# Altium footprint library Connectors_THT.PcbLib: 111 footprints (part 3 of 11)
Each footprint in its own frame and in the unit in brackets; x right, y up, seen from the top. Pads: shape width x height; smd on the part's side, far side on the other; paste and mask are expansions set on the pad; w line width, h text height; cw(c..) or ccw(c..) is an arc to the next point about the centre after c.
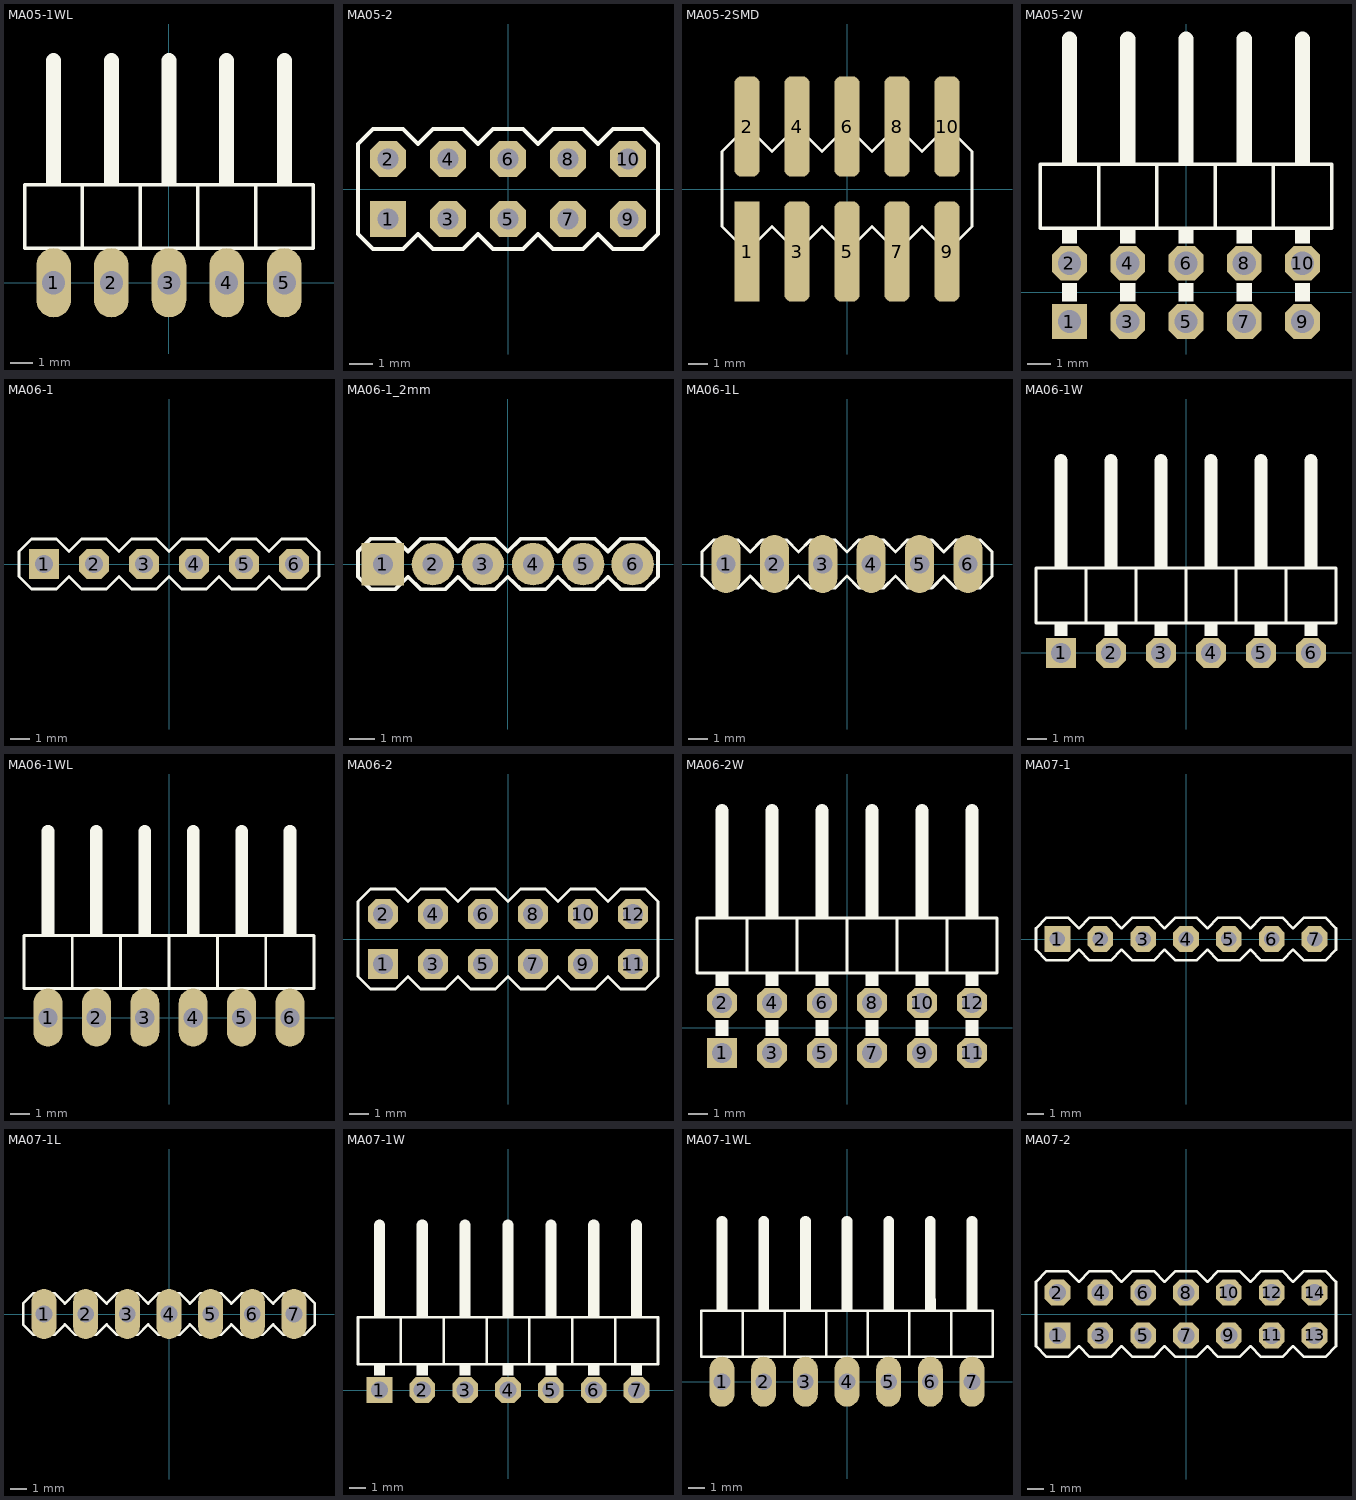
[diagram p2: the footprints below, top view; thin cyan lines are the x and y axes]

## MA05-1WL [mil]
pads (5):
  oval 60x120 hole 40: 1(-200,0) 2(-100,0) 3(0,0) 4(100,0) 5(200,0)
Top Overlay:
  rectangle: -213,34 -187,60
  rectangle: -113,34 -87,60
  rectangle: -13,34 13,60
  rectangle: 87,34 113,60
  rectangle: 187,34 213,60
  rectangle: 187,170 213,200
  rectangle: 87,170 113,200
  rectangle: -13,170 13,200
  rectangle: -113,170 -87,200
  rectangle: -213,170 -187,200
  lines w6: -150,60 -50,60 ; -150,60 -250,60 -250,170 -150,170 ; -150,60 -150,170 ; -150,170 -50,170 ; -50,60 -50,170 ; -50,60 50,60 ; -50,170 50,170 ; 50,60 50,170 ; 50,60 150,60 ; 50,170 150,170 ; 150,60 150,170 ; 150,60 250,60 250,170 150,170
  lines w26: -200,200 -200,385 ; -100,200 -100,385 ; 0,200 0,385 ; 100,200 100,385 ; 200,200 200,385
3D body: height 62.48, standoff 0, extent 187.51,-12.49 212.51,12.51
3D body: height 100, standoff 0, extent 150,60 250,170
3D body: height 62.5, standoff 37.5, extent 187.51,-12.49 212.51,393.76
3D body: height 62.48, standoff 0, extent 87.51,-12.49 112.51,12.51
3D body: height 100, standoff 0, extent 50,60 150,170
3D body: height 62.5, standoff 37.5, extent 87.51,-12.49 112.51,393.76
3D body: height 62.48, standoff 0, extent -12.49,-12.49 12.51,12.51
3D body: height 100, standoff 0, extent -50,60 50,170
3D body: height 62.5, standoff 37.5, extent -12.49,-12.49 12.51,393.76
3D body: height 62.48, standoff 0, extent -112.49,-12.49 -87.49,12.51
3D body: height 100, standoff 0, extent -150,60 -50,170
3D body: height 62.5, standoff 37.5, extent -112.49,-12.49 -87.49,393.76
3D body: height 62.5, standoff 37.5, extent -212.5,-12.49 -187.5,393.75
3D body: height 100, standoff 0, extent -250,60 -150,170
3D body: height 62.48, standoff 0, extent -212.49,-12.49 -187.49,12.51
3D body: height 31.5, standoff 0, extent -212.49,-12.5 -187.49,12.5
3D body: height 31.5, standoff 0, extent -112.49,-12.49 -87.49,12.51
3D body: height 31.5, standoff 0, extent -12.49,-12.49 12.51,12.51
3D body: height 31.5, standoff 0, extent 87.51,-12.49 112.51,12.51
3D body: height 31.5, standoff 0, extent 187.51,-12.49 212.51,12.51

## MA05-2 [mil]
pads (10):
  rect 60x60 hole 35.43: 1(-200,-50)
  oct 60x60 hole 35.43: 2(-200,50) 3(-100,-50) 4(-100,50) 5(0,-50) 6(0,50) 7(100,-50) 8(100,50) 9(200,-50) 10(200,50)
Top Overlay:
  lines w6: -250,-75 -225,-100 -175,-100 -150,-75 -125,-100 -75,-100 -50,-75 -25,-100 25,-100 50,-75 75,-100 125,-100 150,-75 175,-100 225,-100 250,-75 250,75 225,100 175,100 150,75 125,100 75,100 50,75 25,100 -25,100 -50,75 -75,100 -125,100 -150,75 -175,100 -225,100 -250,75 -250,-75
3D body: height 31.5, standoff 0, extent -212.49,-62.49 -187.49,-37.49
3D body: height 338.58, standoff 0, extent -212.49,37.51 -187.49,62.51
3D body: height 98.43, standoff 11.81, extent -250,-100 -150,100
3D body: height 11.81, standoff 0, extent -250,75 -150,100
3D body: height 11.81, standoff 0, extent -250,-100 -150,-75
3D body: height 338.58, standoff 0, extent -212.49,-62.49 -187.49,-37.49
3D body: height 31.5, standoff 0, extent -212.49,37.51 -187.49,62.51
3D body: height 31.5, standoff 0, extent -112.49,-62.49 -87.49,-37.49
3D body: height 338.58, standoff 0, extent -112.49,37.51 -87.49,62.51
3D body: height 98.43, standoff 11.81, extent -150,-100 -50,100
3D body: height 11.81, standoff 0, extent -150,75 -50,100
3D body: height 11.81, standoff 0, extent -150,-100 -50,-75
3D body: height 338.58, standoff 0, extent -112.49,-62.49 -87.49,-37.49
3D body: height 31.5, standoff 0, extent -112.49,37.51 -87.49,62.51
3D body: height 31.5, standoff 0, extent -12.49,-62.49 12.51,-37.49
3D body: height 338.58, standoff 0, extent -12.49,37.51 12.51,62.51
3D body: height 98.43, standoff 11.81, extent -50,-100 50,100
3D body: height 11.81, standoff 0, extent -50,75 50,100
3D body: height 11.81, standoff 0, extent -50,-100 50,-75
3D body: height 338.58, standoff 0, extent -12.49,-62.49 12.51,-37.49
3D body: height 31.5, standoff 0, extent -12.49,37.51 12.51,62.51
3D body: height 31.5, standoff 0, extent 87.51,-62.49 112.51,-37.49
3D body: height 338.58, standoff 0, extent 87.51,37.51 112.51,62.51
3D body: height 98.43, standoff 11.81, extent 50,-100 150,100
3D body: height 11.81, standoff 0, extent 50,75 150,100
3D body: height 11.81, standoff 0, extent 50,-100 150,-75
3D body: height 338.58, standoff 0, extent 87.51,-62.49 112.51,-37.49
3D body: height 31.5, standoff 0, extent 87.51,37.51 112.51,62.51
3D body: height 31.5, standoff 0, extent 187.51,-62.49 212.51,-37.49
3D body: height 338.58, standoff 0, extent 187.51,37.51 212.51,62.51
3D body: height 98.43, standoff 11.81, extent 150,-100 250,100
3D body: height 11.81, standoff 0, extent 150,75 250,100
3D body: height 11.81, standoff 0, extent 150,-100 250,-75
3D body: height 338.58, standoff 0, extent 187.51,-62.49 212.51,-37.49
3D body: height 31.5, standoff 0, extent 187.51,37.51 212.51,62.51

## MA05-2SMD [mil]
pads (10):
  rect 50x200 smd: 1(-200,-125)
  rrect50% 50x200 smd: 2(-200,125) 3(-100,-125) 4(-100,125) 5(0,-125) 6(0,125) 7(100,-125) 8(100,125) 9(200,-125) 10(200,125)
Top Overlay:
  lines w6: -225,-100 -250,-75 -250,75 -225,100 ; -175,-100 -150,-75 -125,-100 ; -175,100 -150,75 -125,100 ; -75,-100 -50,-75 -25,-100 ; -75,100 -50,75 -25,100 ; 25,-100 50,-75 75,-100 ; 25,100 50,75 75,100 ; 125,-100 150,-75 175,-100 ; 125,100 150,75 175,100 ; 225,-100 250,-75 250,75 225,100
3D body: height 363.58, standoff 0, extent -212.49,37.51 -187.49,62.51
3D body: height 123.43, standoff 36.81, extent -250,-100 -150,100
3D body: height 36.81, standoff 25, extent -250,75 -150,100
3D body: height 36.81, standoff 25, extent -250,-100 -150,-75
3D body: height 363.58, standoff 0, extent -212.49,-62.49 -187.49,-37.49
3D body: height 363.58, standoff 0, extent -112.49,37.51 -87.49,62.51
3D body: height 123.43, standoff 36.81, extent -150,-100 -50,100
3D body: height 36.81, standoff 25, extent -150,75 -50,100
3D body: height 36.81, standoff 25, extent -150,-100 -50,-75
3D body: height 363.58, standoff 0, extent -112.49,-62.49 -87.49,-37.49
3D body: height 363.58, standoff 0, extent -12.49,37.51 12.51,62.51
3D body: height 123.43, standoff 36.81, extent -50,-100 50,100
3D body: height 36.81, standoff 25, extent -50,75 50,100
3D body: height 36.81, standoff 25, extent -50,-100 50,-75
3D body: height 363.58, standoff 0, extent -12.49,-62.49 12.51,-37.49
3D body: height 363.58, standoff 0, extent 87.51,37.51 112.51,62.51
3D body: height 123.43, standoff 36.81, extent 50,-100 150,100
3D body: height 36.81, standoff 25, extent 50,75 150,100
3D body: height 36.81, standoff 25, extent 50,-100 150,-75
3D body: height 363.58, standoff 0, extent 87.51,-62.49 112.51,-37.49
3D body: height 363.58, standoff 0, extent 187.51,37.51 212.51,62.51
3D body: height 123.43, standoff 36.81, extent 150,-100 250,100
3D body: height 36.81, standoff 25, extent 150,75 250,100
3D body: height 36.81, standoff 25, extent 150,-100 250,-75
3D body: height 363.58, standoff 0, extent 187.51,-62.49 212.51,-37.49
3D body: height 25, standoff 0, extent -212.5,37.51 -187.5,213.75
3D body: height 25, standoff 0, extent -112.51,37.5 -87.51,213.75
3D body: height 25, standoff 0, extent -12.5,37.51 12.5,213.75
3D body: height 25, standoff 0, extent 87.5,37.51 112.5,213.75
3D body: height 25, standoff 0, extent 187.5,37.51 212.5,213.75
3D body: height 25, standoff 0, extent 187.51,-213.74 212.51,-37.5
3D body: height 25, standoff 0, extent 87.51,-213.74 112.51,-37.5
3D body: height 25, standoff 0, extent -12.49,-213.74 12.51,-37.5
3D body: height 25, standoff 0, extent -112.49,-213.74 -87.49,-37.5
3D body: height 25, standoff 0, extent -212.49,-213.74 -187.49,-37.5

## MA05-2W [mil]
pads (10):
  rect 60x60 hole 40: 1(-200,-50)
  oct 60x60 hole 40: 2(-200,50) 3(-100,-50) 4(-100,50) 5(0,-50) 6(0,50) 7(100,-50) 8(100,50) 9(200,-50) 10(200,50)
Top Overlay:
  rectangle: 187,-16 213,16
  rectangle: 87,-16 113,16
  rectangle: -13,-16 13,16
  rectangle: -113,-16 -87,16
  rectangle: -213,-16 -187,16
  rectangle: -213,84 -187,110
  rectangle: -113,84 -87,110
  rectangle: -13,84 13,110
  rectangle: 87,84 113,110
  rectangle: 187,84 213,110
  rectangle: 187,220 213,250
  rectangle: 87,220 113,250
  rectangle: -13,220 13,250
  rectangle: -113,220 -87,250
  rectangle: -213,220 -187,250
  lines w6: -150,110 -50,110 ; -150,110 -250,110 -250,220 -150,220 ; -150,110 -150,220 ; -150,220 -50,220 ; -50,110 -50,220 ; -50,110 50,110 ; -50,220 50,220 ; 50,110 50,220 ; 50,110 150,110 ; 50,220 150,220 ; 150,110 150,220 ; 150,110 250,110 250,220 150,220
  lines w26: -200,250 -200,435 ; -100,250 -100,435 ; 0,250 0,435 ; 100,250 100,435 ; 200,250 200,435
3D body: height 162.48, standoff 137.52, extent 187.5,-62.49 212.5,443.76
3D body: height 162.48, standoff 0, extent 187.51,-62.49 212.51,-37.49
3D body: height 62.48, standoff 0, extent 187.51,37.51 212.51,62.51
3D body: height 200, standoff 0, extent 150,110 250,220
3D body: height 62.5, standoff 37.5, extent 187.51,37.51 212.51,443.76
3D body: height 162.48, standoff 137.52, extent 87.5,-62.49 112.5,443.76
3D body: height 162.48, standoff 0, extent 87.51,-62.49 112.51,-37.49
3D body: height 62.48, standoff 0, extent 87.51,37.51 112.51,62.51
3D body: height 200, standoff 0, extent 50,110 150,220
3D body: height 62.5, standoff 37.5, extent 87.51,37.51 112.51,443.76
3D body: height 162.48, standoff 137.52, extent -12.5,-62.49 12.5,443.76
3D body: height 162.48, standoff 0, extent -12.49,-62.49 12.51,-37.49
3D body: height 62.48, standoff 0, extent -12.49,37.51 12.51,62.51
3D body: height 200, standoff 0, extent -50,110 50,220
3D body: height 62.5, standoff 37.5, extent -12.49,37.51 12.51,443.76
3D body: height 162.48, standoff 137.52, extent -112.5,-62.49 -87.5,443.76
3D body: height 162.48, standoff 0, extent -112.49,-62.49 -87.49,-37.49
3D body: height 62.48, standoff 0, extent -112.49,37.51 -87.49,62.51
3D body: height 200, standoff 0, extent -150,110 -50,220
3D body: height 62.5, standoff 37.5, extent -112.49,37.51 -87.49,443.76
3D body: height 62.5, standoff 37.5, extent -212.5,37.51 -187.5,443.75
3D body: height 200, standoff 0, extent -250,110 -150,220
3D body: height 62.48, standoff 0, extent -212.49,37.51 -187.49,62.51
3D body: height 162.48, standoff 0, extent -212.5,-62.5 -187.5,-37.5
3D body: height 162.48, standoff 137.52, extent -212.5,-62.5 -187.5,443.75
3D body: height 31.5, standoff 0, extent -212.49,37.51 -187.49,62.51
3D body: height 31.5, standoff 0, extent -212.5,-62.5 -187.5,-37.5
3D body: height 31.5, standoff 0, extent -112.49,37.51 -87.49,62.51
3D body: height 31.5, standoff 0, extent -112.49,-62.49 -87.49,-37.49
3D body: height 31.5, standoff 0, extent -12.49,-62.49 12.51,-37.49
3D body: height 31.5, standoff 0, extent -12.49,37.51 12.51,62.51
3D body: height 31.5, standoff 0, extent 87.51,37.51 112.51,62.51
3D body: height 31.5, standoff 0, extent 87.51,-62.49 112.51,-37.49
3D body: height 31.5, standoff 0, extent 187.51,37.51 212.51,62.51
3D body: height 31.5, standoff 0, extent 187.51,-62.49 212.51,-37.49

## MA06-1 [mil]
pads (6):
  rect 60x60 hole 36: 1(-250,0)
  oct 60x60 hole 36: 2(-150,0) 3(-50,0) 4(50,0) 5(150,0) 6(250,0)
Top Overlay:
  lines w6: -300,-25 -300,25 -275,50 -225,50 -200,25 -175,50 -125,50 -100,25 -75,50 -25,50 0,25 25,50 75,50 100,25 125,50 175,50 200,25 225,50 275,50 300,25 300,-25 275,-50 225,-50 200,-25 175,-50 125,-50 100,-25 75,-50 25,-50 0,-25 -25,-50 -75,-50 -100,-25 -125,-50 -175,-50 -200,-25 -225,-50 -275,-50 -300,-25
3D body: height 338.58, standoff 0, extent 237.51,-12.49 262.51,12.51
3D body: height 98.43, standoff 11.81, extent 200,-50 300,50
3D body: height 11.81, standoff 0, extent 200,-50 300,-25
3D body: height 11.81, standoff 0, extent 200,25 300,50
3D body: height 31.5, standoff 0, extent 237.5,-12.5 262.5,12.5
3D body: height 338.58, standoff 0, extent 137.51,-12.49 162.51,12.51
3D body: height 98.43, standoff 11.81, extent 100,-50 200,50
3D body: height 11.81, standoff 0, extent 100,-50 200,-25
3D body: height 11.81, standoff 0, extent 100,25 200,50
3D body: height 31.5, standoff 0, extent 137.5,-12.5 162.5,12.5
3D body: height 338.58, standoff 0, extent 37.51,-12.49 62.51,12.51
3D body: height 98.43, standoff 11.81, extent 0,-50 100,50
3D body: height 11.81, standoff 0, extent 0,-50 100,-25
3D body: height 11.81, standoff 0, extent 0,25 100,50
3D body: height 31.5, standoff 0, extent 37.5,-12.5 62.5,12.5
3D body: height 338.58, standoff 0, extent -62.49,-12.49 -37.49,12.51
3D body: height 98.43, standoff 11.81, extent -100,-50 0,50
3D body: height 11.81, standoff 0, extent -100,-50 0,-25
3D body: height 11.81, standoff 0, extent -100,25 0,50
3D body: height 31.5, standoff 0, extent -62.5,-12.5 -37.5,12.5
3D body: height 338.58, standoff 0, extent -162.49,-12.49 -137.49,12.51
3D body: height 98.43, standoff 11.81, extent -200,-50 -100,50
3D body: height 11.81, standoff 0, extent -200,-50 -100,-25
3D body: height 11.81, standoff 0, extent -200,25 -100,50
3D body: height 31.5, standoff 0, extent -162.5,-12.5 -137.5,12.5
3D body: height 338.58, standoff 0, extent -262.49,-12.49 -237.49,12.51
3D body: height 98.43, standoff 11.81, extent -300,-50 -200,50
3D body: height 11.81, standoff 0, extent -300,-50 -200,-25
3D body: height 11.81, standoff 0, extent -300,25 -200,50
3D body: height 31.5, standoff 0, extent -262.5,-12.5 -237.5,12.5

## MA06-1_2mm [mm]
pads (6):
  rect 1.7x1.7 hole 0.813: 1(-5,0)
  round 1.7 hole 0.813: 2(-3,0) 3(-1,0) 4(1.016,0) 5(3.023,0) 6(5.004,0)
Top Overlay:
  lines w0.152: -6,-0.5 -5.5,-1 -4.5,-1 -4,-0.5 -3.5,-1 -2.5,-1 -2,-0.5 -1.5,-1 -0.5,-1 0,-0.5 0.508,-1 1.524,-1 2.007,-0.5 2.515,-1 3.505,-1 4.013,-0.5 4.521,-1 5.512,-1 6.02,-0.5 6.02,0.508 5.512,1.016 4.521,1.016 4.013,0.508 3.505,1.016 2.515,1.016 2.007,0.508 1.524,1.016 0.508,1.016 0,0.508 -0.5,1.016 -1.5,1.016 -2,0.508 -2.5,1.016 -3.5,1.016 -4,0.508 -4.5,1.016 -5.5,1.016 -6,0.508 -6,-0.5

## MA06-1L [mil]
pads (6):
  oval 60x120 hole 40: 1(-250,0) 2(-150,0) 3(-50,0) 4(50,0) 5(150,0) 6(250,0)
Top Overlay:
  lines w6: -300,-25 -300,25 -275,50 -225,50 -200,25 -175,50 -125,50 -100,25 -75,50 -25,50 0,25 25,50 75,50 100,25 125,50 175,50 200,25 225,50 275,50 300,25 300,-25 275,-50 225,-50 200,-25 175,-50 125,-50 100,-25 75,-50 25,-50 0,-25 -25,-50 -75,-50 -100,-25 -125,-50 -175,-50 -200,-25 -225,-50 -275,-50 -300,-25
3D body: height 338.58, standoff 0, extent 237.51,-12.49 262.51,12.51
3D body: height 98.43, standoff 11.81, extent 200,-50 300,50
3D body: height 11.81, standoff 0, extent 200,-50 300,-25
3D body: height 11.81, standoff 0, extent 200,25 300,50
3D body: height 31.5, standoff 0, extent 237.5,-12.5 262.5,12.5
3D body: height 338.58, standoff 0, extent 137.51,-12.49 162.51,12.51
3D body: height 98.43, standoff 11.81, extent 100,-50 200,50
3D body: height 11.81, standoff 0, extent 100,-50 200,-25
3D body: height 11.81, standoff 0, extent 100,25 200,50
3D body: height 31.5, standoff 0, extent 137.5,-12.5 162.5,12.5
3D body: height 338.58, standoff 0, extent 37.51,-12.49 62.51,12.51
3D body: height 98.43, standoff 11.81, extent 0,-50 100,50
3D body: height 11.81, standoff 0, extent 0,-50 100,-25
3D body: height 11.81, standoff 0, extent 0,25 100,50
3D body: height 31.5, standoff 0, extent 37.5,-12.5 62.5,12.5
3D body: height 338.58, standoff 0, extent -62.49,-12.49 -37.49,12.51
3D body: height 98.43, standoff 11.81, extent -100,-50 0,50
3D body: height 11.81, standoff 0, extent -100,-50 0,-25
3D body: height 11.81, standoff 0, extent -100,25 0,50
3D body: height 31.5, standoff 0, extent -62.5,-12.5 -37.5,12.5
3D body: height 338.58, standoff 0, extent -162.49,-12.49 -137.49,12.51
3D body: height 98.43, standoff 11.81, extent -200,-50 -100,50
3D body: height 11.81, standoff 0, extent -200,-50 -100,-25
3D body: height 11.81, standoff 0, extent -200,25 -100,50
3D body: height 31.5, standoff 0, extent -162.5,-12.5 -137.5,12.5
3D body: height 338.58, standoff 0, extent -262.49,-12.49 -237.49,12.51
3D body: height 98.43, standoff 11.81, extent -300,-50 -200,50
3D body: height 11.81, standoff 0, extent -300,-50 -200,-25
3D body: height 11.81, standoff 0, extent -300,25 -200,50
3D body: height 31.5, standoff 0, extent -262.5,-12.5 -237.5,12.5

## MA06-1W [mil]
pads (6):
  rect 60x60 hole 40: 1(-250,0)
  oct 60x60 hole 40: 2(-150,0) 3(-50,0) 4(50,0) 5(150,0) 6(250,0)
Top Overlay:
  rectangle: -263,34 -237,60
  rectangle: -163,34 -137,60
  rectangle: -63,34 -37,60
  rectangle: 37,34 63,60
  rectangle: 137,34 163,60
  rectangle: 237,34 263,60
  rectangle: 137,170 163,200
  rectangle: 37,170 63,200
  rectangle: -63,170 -37,200
  rectangle: -163,170 -137,200
  rectangle: -263,170 -237,200
  rectangle: 237,170 263,200
  lines w6: -200,60 -100,60 ; -200,60 -300,60 -300,170 -200,170 ; -200,60 -200,170 ; -200,170 -100,170 ; -100,60 -100,170 ; -100,60 0,60 ; -100,170 0,170 ; 0,60 0,170 ; 0,60 100,60 ; 0,170 100,170 ; 100,60 100,170 ; 100,60 200,60 ; 100,170 200,170 ; 200,60 200,170 ; 200,60 300,60 300,170 200,170
  lines w26: -250,200 -250,385 ; -150,200 -150,385 ; -50,200 -50,385 ; 50,200 50,385 ; 150,200 150,385 ; 250,200 250,385
3D body: height 62.48, standoff 0, extent 137.51,-12.49 162.51,12.51
3D body: height 100, standoff 0, extent 100,60 200,170
3D body: height 62.5, standoff 37.5, extent 137.51,-12.49 162.51,393.76
3D body: height 62.48, standoff 0, extent 37.51,-12.49 62.51,12.51
3D body: height 100, standoff 0, extent 0,60 100,170
3D body: height 62.5, standoff 37.5, extent 37.51,-12.49 62.51,393.76
3D body: height 62.48, standoff 0, extent -62.49,-12.49 -37.49,12.51
3D body: height 100, standoff 0, extent -100,60 0,170
3D body: height 62.5, standoff 37.5, extent -62.49,-12.49 -37.49,393.76
3D body: height 62.48, standoff 0, extent -162.49,-12.49 -137.49,12.51
3D body: height 100, standoff 0, extent -200,60 -100,170
3D body: height 62.5, standoff 37.5, extent -162.49,-12.49 -137.49,393.76
3D body: height 62.5, standoff 37.5, extent -262.5,-12.49 -237.5,393.75
3D body: height 100, standoff 0, extent -300,60 -200,170
3D body: height 62.48, standoff 0, extent -262.49,-12.49 -237.49,12.51
3D body: height 31.5, standoff 0, extent -262.49,-12.5 -237.49,12.5
3D body: height 31.5, standoff 0, extent -162.49,-12.49 -137.49,12.51
3D body: height 31.5, standoff 0, extent -62.49,-12.49 -37.49,12.51
3D body: height 31.5, standoff 0, extent 37.51,-12.49 62.51,12.51
3D body: height 31.5, standoff 0, extent 137.51,-12.49 162.51,12.51
3D body: height 31.5, standoff 0, extent 237.51,-12.49 262.51,12.51
3D body: height 62.48, standoff 0, extent 237.51,-12.49 262.51,12.51
3D body: height 100, standoff 0, extent 200,60 300,170
3D body: height 62.5, standoff 37.5, extent 237.5,-12.49 262.5,393.75

## MA06-1WL [mil]
pads (6):
  oval 60x120 hole 40: 1(-250,0) 2(-150,0) 3(-50,0) 4(50,0) 5(150,0) 6(250,0)
Top Overlay:
  rectangle: 237,170 263,200
  rectangle: -263,170 -237,200
  rectangle: -163,170 -137,200
  rectangle: -63,170 -37,200
  rectangle: 37,170 63,200
  rectangle: 137,170 163,200
  rectangle: 237,34 263,60
  rectangle: 137,34 163,60
  rectangle: 37,34 63,60
  rectangle: -63,34 -37,60
  rectangle: -163,34 -137,60
  rectangle: -263,34 -237,60
  lines w6: -200,60 -200,170 ; -200,60 -300,60 -300,170 -200,170 ; -200,60 -100,60 ; -200,170 -100,170 ; -100,60 0,60 ; -100,60 -100,170 ; -100,170 0,170 ; 0,60 100,60 ; 0,60 0,170 ; 0,170 100,170 ; 100,60 200,60 ; 100,60 100,170 ; 100,170 200,170 ; 200,60 300,60 300,170 200,170 ; 200,60 200,170
  lines w26: -250,200 -250,385 ; -150,200 -150,385 ; -50,200 -50,385 ; 50,200 50,385 ; 150,200 150,385 ; 250,200 250,385
3D body: height 62.5, standoff 37.5, extent 237.5,-12.49 262.5,393.75
3D body: height 100, standoff 0, extent 200,60 300,170
3D body: height 62.48, standoff 0, extent 237.51,-12.49 262.51,12.51
3D body: height 31.5, standoff 0, extent 237.51,-12.49 262.51,12.51
3D body: height 31.5, standoff 0, extent 137.51,-12.49 162.51,12.51
3D body: height 31.5, standoff 0, extent 37.51,-12.49 62.51,12.51
3D body: height 31.5, standoff 0, extent -62.49,-12.49 -37.49,12.51
3D body: height 31.5, standoff 0, extent -162.49,-12.49 -137.49,12.51
3D body: height 31.5, standoff 0, extent -262.49,-12.5 -237.49,12.5
3D body: height 62.48, standoff 0, extent -262.49,-12.49 -237.49,12.51
3D body: height 100, standoff 0, extent -300,60 -200,170
3D body: height 62.5, standoff 37.5, extent -262.5,-12.49 -237.5,393.75
3D body: height 62.5, standoff 37.5, extent -162.49,-12.49 -137.49,393.76
3D body: height 100, standoff 0, extent -200,60 -100,170
3D body: height 62.48, standoff 0, extent -162.49,-12.49 -137.49,12.51
3D body: height 62.5, standoff 37.5, extent -62.49,-12.49 -37.49,393.76
3D body: height 100, standoff 0, extent -100,60 0,170
3D body: height 62.48, standoff 0, extent -62.49,-12.49 -37.49,12.51
3D body: height 62.5, standoff 37.5, extent 37.51,-12.49 62.51,393.76
3D body: height 100, standoff 0, extent 0,60 100,170
3D body: height 62.48, standoff 0, extent 37.51,-12.49 62.51,12.51
3D body: height 62.5, standoff 37.5, extent 137.51,-12.49 162.51,393.76
3D body: height 100, standoff 0, extent 100,60 200,170
3D body: height 62.48, standoff 0, extent 137.51,-12.49 162.51,12.51

## MA06-2 [mil]
pads (12):
  rect 60x60 hole 40: 1(-250,-50)
  oct 60x60 hole 40: 2(-250,50) 3(-150,-50) 4(-150,50) 5(-50,-50) 6(-50,50) 7(50,-50) 8(50,50) 9(150,-50) 10(150,50) 11(250,-50) 12(250,50)
Top Overlay:
  lines w6: -300,-75 -300,75 -275,100 -225,100 -200,75 -175,100 -125,100 -100,75 -75,100 -25,100 0,75 25,100 75,100 100,75 125,100 175,100 200,75 225,100 275,100 300,75 300,-75 275,-100 225,-100 200,-75 175,-100 125,-100 100,-75 75,-100 25,-100 0,-75 -25,-100 -75,-100 -100,-75 -125,-100 -175,-100 -200,-75 -225,-100 -275,-100 -300,-75
3D body: height 31.5, standoff 0, extent -262.49,-62.49 -237.49,-37.49
3D body: height 338.58, standoff 0, extent -262.49,37.51 -237.49,62.51
3D body: height 98.43, standoff 11.81, extent -300,-100 -200,100
3D body: height 11.81, standoff 0, extent -300,75 -200,100
3D body: height 11.81, standoff 0, extent -300,-100 -200,-75
3D body: height 338.58, standoff 0, extent -262.49,-62.49 -237.49,-37.49
3D body: height 31.5, standoff 0, extent -262.49,37.51 -237.49,62.51
3D body: height 31.5, standoff 0, extent -162.49,-62.49 -137.49,-37.49
3D body: height 338.58, standoff 0, extent -162.49,37.51 -137.49,62.51
3D body: height 98.43, standoff 11.81, extent -200,-100 -100,100
3D body: height 11.81, standoff 0, extent -200,75 -100,100
3D body: height 11.81, standoff 0, extent -200,-100 -100,-75
3D body: height 338.58, standoff 0, extent -162.49,-62.49 -137.49,-37.49
3D body: height 31.5, standoff 0, extent -162.49,37.51 -137.49,62.51
3D body: height 31.5, standoff 0, extent -62.49,-62.49 -37.49,-37.49
3D body: height 338.58, standoff 0, extent -62.49,37.51 -37.49,62.51
3D body: height 98.43, standoff 11.81, extent -100,-100 0,100
3D body: height 11.81, standoff 0, extent -100,75 0,100
3D body: height 11.81, standoff 0, extent -100,-100 0,-75
3D body: height 338.58, standoff 0, extent -62.49,-62.49 -37.49,-37.49
3D body: height 31.5, standoff 0, extent -62.49,37.51 -37.49,62.51
3D body: height 31.5, standoff 0, extent 37.51,-62.49 62.51,-37.49
3D body: height 338.58, standoff 0, extent 37.51,37.51 62.51,62.51
3D body: height 98.43, standoff 11.81, extent 0,-100 100,100
3D body: height 11.81, standoff 0, extent 0,75 100,100
3D body: height 11.81, standoff 0, extent 0,-100 100,-75
3D body: height 338.58, standoff 0, extent 37.51,-62.49 62.51,-37.49
3D body: height 31.5, standoff 0, extent 37.51,37.51 62.51,62.51
3D body: height 31.5, standoff 0, extent 137.51,-62.49 162.51,-37.49
3D body: height 338.58, standoff 0, extent 137.51,37.51 162.51,62.51
3D body: height 98.43, standoff 11.81, extent 100,-100 200,100
3D body: height 11.81, standoff 0, extent 100,75 200,100
3D body: height 11.81, standoff 0, extent 100,-100 200,-75
3D body: height 338.58, standoff 0, extent 137.51,-62.49 162.51,-37.49
3D body: height 31.5, standoff 0, extent 137.51,37.51 162.51,62.51
3D body: height 31.5, standoff 0, extent 237.51,-62.49 262.51,-37.49
3D body: height 338.58, standoff 0, extent 237.51,37.51 262.51,62.51
3D body: height 98.43, standoff 11.81, extent 200,-100 300,100
3D body: height 11.81, standoff 0, extent 200,75 300,100
3D body: height 11.81, standoff 0, extent 200,-100 300,-75
3D body: height 338.58, standoff 0, extent 237.51,-62.49 262.51,-37.49
3D body: height 31.5, standoff 0, extent 237.51,37.51 262.51,62.51

## MA06-2W [mil]
pads (12):
  rect 60x60 hole 40: 1(-250,-50)
  oct 60x60 hole 40: 2(-250,50) 3(-150,-50) 4(-150,50) 5(-50,-50) 6(-50,50) 7(50,-50) 8(50,50) 9(150,-50) 10(150,50) 11(250,-50) 12(250,50)
Top Overlay:
  rectangle: 237,220 263,250
  rectangle: -263,220 -237,250
  rectangle: -163,220 -137,250
  rectangle: -63,220 -37,250
  rectangle: 37,220 63,250
  rectangle: 137,220 163,250
  rectangle: 237,84 263,110
  rectangle: 137,84 163,110
  rectangle: 37,84 63,110
  rectangle: -63,84 -37,110
  rectangle: -163,84 -137,110
  rectangle: -263,84 -237,110
  rectangle: -263,-16 -237,16
  rectangle: -163,-16 -137,16
  rectangle: -63,-16 -37,16
  rectangle: 37,-16 63,16
  rectangle: 137,-16 163,16
  rectangle: 237,-16 263,16
  lines w6: -200,110 -200,220 ; -200,110 -300,110 -300,220 -200,220 ; -200,110 -100,110 ; -200,220 -100,220 ; -100,110 0,110 ; -100,110 -100,220 ; -100,220 0,220 ; 0,110 100,110 ; 0,110 0,220 ; 0,220 100,220 ; 100,110 200,110 ; 100,110 100,220 ; 100,220 200,220 ; 200,110 300,110 300,220 200,220 ; 200,110 200,220
  lines w26: -250,250 -250,435 ; -150,250 -150,435 ; -50,250 -50,435 ; 50,250 50,435 ; 150,250 150,435 ; 250,250 250,435
3D body: height 31.5, standoff 0, extent 137.51,-62.49 162.51,-37.49
3D body: height 31.5, standoff 0, extent 137.51,37.51 162.51,62.51
3D body: height 31.5, standoff 0, extent 37.51,-62.49 62.51,-37.49
3D body: height 31.5, standoff 0, extent 37.51,37.51 62.51,62.51
3D body: height 31.5, standoff 0, extent -62.49,37.51 -37.49,62.51
3D body: height 31.5, standoff 0, extent -62.49,-62.49 -37.49,-37.49
3D body: height 31.5, standoff 0, extent -162.49,-62.49 -137.49,-37.49
3D body: height 31.5, standoff 0, extent -162.49,37.51 -137.49,62.51
3D body: height 31.5, standoff 0, extent -262.5,-62.5 -237.5,-37.5
3D body: height 31.5, standoff 0, extent -262.49,37.5 -237.49,62.5
3D body: height 162.48, standoff 137.52, extent -262.5,-62.5 -237.5,443.75
3D body: height 162.48, standoff 0, extent -262.5,-62.5 -237.5,-37.5
3D body: height 62.48, standoff 0, extent -262.49,37.51 -237.49,62.51
3D body: height 200, standoff 0, extent -300,110 -200,220
3D body: height 62.5, standoff 37.5, extent -262.5,37.51 -237.5,443.75
3D body: height 62.5, standoff 37.5, extent -162.49,37.51 -137.49,443.76
3D body: height 200, standoff 0, extent -200,110 -100,220
3D body: height 62.48, standoff 0, extent -162.49,37.51 -137.49,62.51
3D body: height 162.48, standoff 0, extent -162.49,-62.49 -137.49,-37.49
3D body: height 162.48, standoff 137.52, extent -162.5,-62.49 -137.5,443.76
3D body: height 62.5, standoff 37.5, extent -62.49,37.51 -37.49,443.76
3D body: height 200, standoff 0, extent -100,110 0,220
3D body: height 62.48, standoff 0, extent -62.49,37.51 -37.49,62.51
3D body: height 162.48, standoff 0, extent -62.49,-62.49 -37.49,-37.49
3D body: height 162.48, standoff 137.52, extent -62.5,-62.49 -37.5,443.76
3D body: height 62.5, standoff 37.5, extent 37.51,37.51 62.51,443.76
3D body: height 200, standoff 0, extent 0,110 100,220
3D body: height 62.48, standoff 0, extent 37.51,37.51 62.51,62.51
3D body: height 162.48, standoff 0, extent 37.51,-62.49 62.51,-37.49
3D body: height 162.48, standoff 137.52, extent 37.5,-62.49 62.5,443.76
3D body: height 62.5, standoff 37.5, extent 137.51,37.51 162.51,443.76
3D body: height 200, standoff 0, extent 100,110 200,220
3D body: height 62.48, standoff 0, extent 137.51,37.51 162.51,62.51
3D body: height 162.48, standoff 0, extent 137.51,-62.49 162.51,-37.49
3D body: height 162.48, standoff 137.52, extent 137.5,-62.49 162.5,443.76
3D body: height 31.5, standoff 0, extent 237.5,-62.5 262.5,-37.5
3D body: height 31.5, standoff 0, extent 237.51,37.5 262.51,62.5
3D body: height 162.48, standoff 137.52, extent 237.5,-62.5 262.5,443.75
3D body: height 162.48, standoff 0, extent 237.5,-62.5 262.5,-37.5
3D body: height 62.48, standoff 0, extent 237.51,37.51 262.51,62.51
3D body: height 200, standoff 0, extent 200,110 300,220
3D body: height 62.5, standoff 37.5, extent 237.5,37.51 262.5,443.75

## MA07-1 [mil]
pads (7):
  rect 60x60 hole 36: 1(-300,0)
  oct 60x60 hole 36: 2(-200,0) 3(-100,0) 4(0,0) 5(100,0) 6(200,0) 7(300,0)
Top Overlay:
  lines w6: -350,-25 -325,-50 -275,-50 -250,-25 -225,-50 -175,-50 -150,-25 -125,-50 -75,-50 -50,-25 -25,-50 25,-50 50,-25 75,-50 125,-50 150,-25 175,-50 225,-50 250,-25 275,-50 325,-50 350,-25 350,25 325,50 275,50 250,25 225,50 175,50 150,25 125,50 75,50 50,25 25,50 -25,50 -50,25 -75,50 -125,50 -150,25 -175,50 -225,50 -250,25 -275,50 -325,50 -350,25 -350,-25
3D body: height 31.5, standoff 0, extent -312.5,-12.5 -287.5,12.5
3D body: height 11.81, standoff 0, extent -350,25 -250,50
3D body: height 11.81, standoff 0, extent -350,-50 -250,-25
3D body: height 98.43, standoff 11.81, extent -350,-50 -250,50
3D body: height 338.58, standoff 0, extent -312.49,-12.49 -287.49,12.51
3D body: height 31.5, standoff 0, extent -212.5,-12.5 -187.5,12.5
3D body: height 11.81, standoff 0, extent -250,25 -150,50
3D body: height 11.81, standoff 0, extent -250,-50 -150,-25
3D body: height 98.43, standoff 11.81, extent -250,-50 -150,50
3D body: height 338.58, standoff 0, extent -212.49,-12.49 -187.49,12.51
3D body: height 31.5, standoff 0, extent -112.5,-12.5 -87.5,12.5
3D body: height 11.81, standoff 0, extent -150,25 -50,50
3D body: height 11.81, standoff 0, extent -150,-50 -50,-25
3D body: height 98.43, standoff 11.81, extent -150,-50 -50,50
3D body: height 338.58, standoff 0, extent -112.49,-12.49 -87.49,12.51
3D body: height 31.5, standoff 0, extent -12.5,-12.5 12.5,12.5
3D body: height 11.81, standoff 0, extent -50,25 50,50
3D body: height 11.81, standoff 0, extent -50,-50 50,-25
3D body: height 98.43, standoff 11.81, extent -50,-50 50,50
3D body: height 338.58, standoff 0, extent -12.49,-12.49 12.51,12.51
3D body: height 31.5, standoff 0, extent 87.5,-12.5 112.5,12.5
3D body: height 11.81, standoff 0, extent 50,25 150,50
3D body: height 11.81, standoff 0, extent 50,-50 150,-25
3D body: height 98.43, standoff 11.81, extent 50,-50 150,50
3D body: height 338.58, standoff 0, extent 87.51,-12.49 112.51,12.51
3D body: height 31.5, standoff 0, extent 187.5,-12.5 212.5,12.5
3D body: height 11.81, standoff 0, extent 150,25 250,50
3D body: height 11.81, standoff 0, extent 150,-50 250,-25
3D body: height 98.43, standoff 11.81, extent 150,-50 250,50
3D body: height 338.58, standoff 0, extent 187.51,-12.49 212.51,12.51
3D body: height 31.5, standoff 0, extent 287.5,-12.5 312.5,12.5
3D body: height 11.81, standoff 0, extent 250,25 350,50
3D body: height 11.81, standoff 0, extent 250,-50 350,-25
3D body: height 98.43, standoff 11.81, extent 250,-50 350,50
3D body: height 338.58, standoff 0, extent 287.51,-12.49 312.51,12.51

## MA07-1L [mil]
pads (7):
  oval 60x120 hole 40: 1(-300,0) 2(-200,0) 3(-100,0) 4(0,0) 5(100,0) 6(200,0) 7(300,0)
Top Overlay:
  lines w6: -350,-25 -350,25 -325,50 -275,50 -250,25 -225,50 -175,50 -150,25 -125,50 -75,50 -50,25 -25,50 25,50 50,25 75,50 125,50 150,25 175,50 225,50 250,25 275,50 325,50 350,25 350,-25 325,-50 275,-50 250,-25 225,-50 175,-50 150,-25 125,-50 75,-50 50,-25 25,-50 -25,-50 -50,-25 -75,-50 -125,-50 -150,-25 -175,-50 -225,-50 -250,-25 -275,-50 -325,-50 -350,-25
3D body: height 31.5, standoff 0, extent -312.5,-12.5 -287.5,12.5
3D body: height 11.81, standoff 0, extent -350,25 -250,50
3D body: height 11.81, standoff 0, extent -350,-50 -250,-25
3D body: height 98.43, standoff 11.81, extent -350,-50 -250,50
3D body: height 338.58, standoff 0, extent -312.49,-12.49 -287.49,12.51
3D body: height 31.5, standoff 0, extent -212.5,-12.5 -187.5,12.5
3D body: height 11.81, standoff 0, extent -250,25 -150,50
3D body: height 11.81, standoff 0, extent -250,-50 -150,-25
3D body: height 98.43, standoff 11.81, extent -250,-50 -150,50
3D body: height 338.58, standoff 0, extent -212.49,-12.49 -187.49,12.51
3D body: height 31.5, standoff 0, extent -112.5,-12.5 -87.5,12.5
3D body: height 11.81, standoff 0, extent -150,25 -50,50
3D body: height 11.81, standoff 0, extent -150,-50 -50,-25
3D body: height 98.43, standoff 11.81, extent -150,-50 -50,50
3D body: height 338.58, standoff 0, extent -112.49,-12.49 -87.49,12.51
3D body: height 31.5, standoff 0, extent -12.5,-12.5 12.5,12.5
3D body: height 11.81, standoff 0, extent -50,25 50,50
3D body: height 11.81, standoff 0, extent -50,-50 50,-25
3D body: height 98.43, standoff 11.81, extent -50,-50 50,50
3D body: height 338.58, standoff 0, extent -12.49,-12.49 12.51,12.51
3D body: height 31.5, standoff 0, extent 87.5,-12.5 112.5,12.5
3D body: height 11.81, standoff 0, extent 50,25 150,50
3D body: height 11.81, standoff 0, extent 50,-50 150,-25
3D body: height 98.43, standoff 11.81, extent 50,-50 150,50
3D body: height 338.58, standoff 0, extent 87.51,-12.49 112.51,12.51
3D body: height 31.5, standoff 0, extent 187.5,-12.5 212.5,12.5
3D body: height 11.81, standoff 0, extent 150,25 250,50
3D body: height 11.81, standoff 0, extent 150,-50 250,-25
3D body: height 98.43, standoff 11.81, extent 150,-50 250,50
3D body: height 338.58, standoff 0, extent 187.51,-12.49 212.51,12.51
3D body: height 31.5, standoff 0, extent 287.5,-12.5 312.5,12.5
3D body: height 11.81, standoff 0, extent 250,25 350,50
3D body: height 11.81, standoff 0, extent 250,-50 350,-25
3D body: height 98.43, standoff 11.81, extent 250,-50 350,50
3D body: height 338.58, standoff 0, extent 287.51,-12.49 312.51,12.51

## MA07-1W [mil]
pads (7):
  rect 60x60 hole 40: 1(-300,0)
  oct 60x60 hole 40: 2(-200,0) 3(-100,0) 4(0,0) 5(100,0) 6(200,0) 7(300,0)
Top Overlay:
  rectangle: -313,34 -287,60
  rectangle: -213,34 -187,60
  rectangle: -113,34 -87,60
  rectangle: -13,34 13,60
  rectangle: 87,34 113,60
  rectangle: 187,34 213,60
  rectangle: 287,34 313,60
  rectangle: 87,170 113,200
  rectangle: -13,170 13,200
  rectangle: -113,170 -87,200
  rectangle: -213,170 -187,200
  rectangle: -313,170 -287,200
  rectangle: 287,170 313,200
  rectangle: 187,170 213,200
  lines w6: -250,60 -150,60 ; -250,60 -350,60 -350,170 -250,170 ; -250,60 -250,170 ; -250,170 -150,170 ; -150,60 -150,170 ; -150,60 -50,60 ; -150,170 -50,170 ; -50,60 -50,170 ; -50,60 50,60 ; -50,170 50,170 ; 50,60 50,170 ; 50,60 150,60 ; 50,170 150,170 ; 150,60 150,170 ; 150,60 250,60 ; 150,170 250,170 ; 250,60 350,60 350,170 250,170 ; 250,60 250,170
  lines w26: -300,200 -300,385 ; -200,200 -200,385 ; -100,200 -100,385 ; 0,200 0,385 ; 100,200 100,385 ; 200,200 200,385 ; 300,200 300,385
3D body: height 62.48, standoff 0, extent 87.51,-12.49 112.51,12.51
3D body: height 100, standoff 0, extent 50,60 150,170
3D body: height 62.5, standoff 37.5, extent 87.51,-12.49 112.51,393.76
3D body: height 62.48, standoff 0, extent -12.49,-12.49 12.51,12.51
3D body: height 100, standoff 0, extent -50,60 50,170
3D body: height 62.5, standoff 37.5, extent -12.49,-12.49 12.51,393.76
3D body: height 62.48, standoff 0, extent -112.49,-12.49 -87.49,12.51
3D body: height 100, standoff 0, extent -150,60 -50,170
3D body: height 62.5, standoff 37.5, extent -112.49,-12.49 -87.49,393.76
3D body: height 62.48, standoff 0, extent -212.49,-12.49 -187.49,12.51
3D body: height 100, standoff 0, extent -250,60 -150,170
3D body: height 62.5, standoff 37.5, extent -212.49,-12.49 -187.49,393.76
3D body: height 62.5, standoff 37.5, extent -312.5,-12.49 -287.5,393.75
3D body: height 100, standoff 0, extent -350,60 -250,170
3D body: height 62.48, standoff 0, extent -312.49,-12.49 -287.49,12.51
3D body: height 31.5, standoff 0, extent -312.49,-12.5 -287.49,12.5
3D body: height 31.5, standoff 0, extent -212.49,-12.49 -187.49,12.51
3D body: height 31.5, standoff 0, extent -112.49,-12.49 -87.49,12.51
3D body: height 31.5, standoff 0, extent -12.49,-12.49 12.51,12.51
3D body: height 31.5, standoff 0, extent 87.51,-12.49 112.51,12.51
3D body: height 31.5, standoff 0, extent 287.51,-12.49 312.51,12.51
3D body: height 31.5, standoff 0, extent 187.51,-12.49 212.51,12.51
3D body: height 62.48, standoff 0, extent 187.51,-12.49 212.51,12.51
3D body: height 100, standoff 0, extent 150,60 250,170
3D body: height 62.5, standoff 37.5, extent 187.5,-12.49 212.5,393.75
3D body: height 62.5, standoff 37.5, extent 287.51,-12.49 312.51,393.76
3D body: height 100, standoff 0, extent 250,60 350,170
3D body: height 62.48, standoff 0, extent 287.51,-12.49 312.51,12.51

## MA07-1WL [mil]
pads (7):
  oval 60x120 hole 40: 1(-300,0) 2(-200,0) 3(-100,0) 4(0,0) 5(100,0) 6(200,0) 7(300,0)
Top Overlay:
  rectangle: 187,170 213,200
  rectangle: 287,170 313,200
  rectangle: -313,170 -287,200
  rectangle: -213,170 -187,200
  rectangle: -113,170 -87,200
  rectangle: -13,170 13,200
  rectangle: 87,170 113,200
  rectangle: 287,34 313,60
  rectangle: 187,34 213,60
  rectangle: 87,34 113,60
  rectangle: -13,34 13,60
  rectangle: -113,34 -87,60
  rectangle: -213,34 -187,60
  rectangle: -313,34 -287,60
  lines w6: -250,60 -250,170 ; -250,60 -350,60 -350,170 -250,170 ; -250,60 -150,60 ; -250,170 -150,170 ; -150,60 -50,60 ; -150,60 -150,170 ; -150,170 -50,170 ; -50,60 50,60 ; -50,60 -50,170 ; -50,170 50,170 ; 50,60 150,60 ; 50,60 50,170 ; 50,170 150,170 ; 150,60 250,60 ; 150,60 150,170 ; 150,170 250,170 ; 250,60 250,170 ; 250,60 350,60 350,170 250,170
  lines w26: -300,200 -300,385 ; -200,200 -200,385 ; -100,200 -100,385 ; 0,200 0,385 ; 100,200 100,385 ; 200,200 200,385 ; 300,200 300,385
3D body: height 62.48, standoff 0, extent 287.51,-12.49 312.51,12.51
3D body: height 100, standoff 0, extent 250,60 350,170
3D body: height 62.5, standoff 37.5, extent 287.51,-12.49 312.51,393.76
3D body: height 62.5, standoff 37.5, extent 187.5,-12.49 212.5,393.75
3D body: height 100, standoff 0, extent 150,60 250,170
3D body: height 62.48, standoff 0, extent 187.51,-12.49 212.51,12.51
3D body: height 31.5, standoff 0, extent 187.51,-12.49 212.51,12.51
3D body: height 31.5, standoff 0, extent 287.51,-12.49 312.51,12.51
3D body: height 31.5, standoff 0, extent 87.51,-12.49 112.51,12.51
3D body: height 31.5, standoff 0, extent -12.49,-12.49 12.51,12.51
3D body: height 31.5, standoff 0, extent -112.49,-12.49 -87.49,12.51
3D body: height 31.5, standoff 0, extent -212.49,-12.49 -187.49,12.51
3D body: height 31.5, standoff 0, extent -312.49,-12.5 -287.49,12.5
3D body: height 62.48, standoff 0, extent -312.49,-12.49 -287.49,12.51
3D body: height 100, standoff 0, extent -350,60 -250,170
3D body: height 62.5, standoff 37.5, extent -312.5,-12.49 -287.5,393.75
3D body: height 62.5, standoff 37.5, extent -212.49,-12.49 -187.49,393.76
3D body: height 100, standoff 0, extent -250,60 -150,170
3D body: height 62.48, standoff 0, extent -212.49,-12.49 -187.49,12.51
3D body: height 62.5, standoff 37.5, extent -112.49,-12.49 -87.49,393.76
3D body: height 100, standoff 0, extent -150,60 -50,170
3D body: height 62.48, standoff 0, extent -112.49,-12.49 -87.49,12.51
3D body: height 62.5, standoff 37.5, extent -12.49,-12.49 12.51,393.76
3D body: height 100, standoff 0, extent -50,60 50,170
3D body: height 62.48, standoff 0, extent -12.49,-12.49 12.51,12.51
3D body: height 62.5, standoff 37.5, extent 87.51,-12.49 112.51,393.76
3D body: height 100, standoff 0, extent 50,60 150,170
3D body: height 62.48, standoff 0, extent 87.51,-12.49 112.51,12.51

## MA07-2 [mil]
pads (14):
  rect 60x60 hole 40: 1(-300,-50)
  oct 60x60 hole 40: 2(-300,50) 3(-200,-50) 4(-200,50) 5(-100,-50) 6(-100,50) 7(0,-50) 8(0,50) 9(100,-50) 10(100,50) 11(200,-50) 12(200,50) 13(300,-50) 14(300,50)
Top Overlay:
  lines w6: -350,-75 -350,75 -325,100 -275,100 -250,75 -225,100 -175,100 -150,75 -125,100 -75,100 -50,75 -25,100 25,100 50,75 75,100 125,100 150,75 175,100 225,100 250,75 275,100 325,100 350,75 350,-75 325,-100 275,-100 250,-75 225,-100 175,-100 150,-75 125,-100 75,-100 50,-75 25,-100 -25,-100 -50,-75 -75,-100 -125,-100 -150,-75 -175,-100 -225,-100 -250,-75 -275,-100 -325,-100 -350,-75
3D body: height 31.5, standoff 0, extent 287.51,37.51 312.51,62.51
3D body: height 338.58, standoff 0, extent 287.51,-62.49 312.51,-37.49
3D body: height 11.81, standoff 0, extent 250,-100 350,-75
3D body: height 11.81, standoff 0, extent 250,75 350,100
3D body: height 98.43, standoff 11.81, extent 250,-100 350,100
3D body: height 338.58, standoff 0, extent 287.51,37.51 312.51,62.51
3D body: height 31.5, standoff 0, extent 287.51,-62.49 312.51,-37.49
3D body: height 31.5, standoff 0, extent 187.51,37.51 212.51,62.51
3D body: height 338.58, standoff 0, extent 187.51,-62.49 212.51,-37.49
3D body: height 11.81, standoff 0, extent 150,-100 250,-75
3D body: height 11.81, standoff 0, extent 150,75 250,100
3D body: height 98.43, standoff 11.81, extent 150,-100 250,100
3D body: height 338.58, standoff 0, extent 187.51,37.51 212.51,62.51
3D body: height 31.5, standoff 0, extent 187.51,-62.49 212.51,-37.49
3D body: height 31.5, standoff 0, extent 87.51,37.51 112.51,62.51
3D body: height 338.58, standoff 0, extent 87.51,-62.49 112.51,-37.49
3D body: height 11.81, standoff 0, extent 50,-100 150,-75
3D body: height 11.81, standoff 0, extent 50,75 150,100
3D body: height 98.43, standoff 11.81, extent 50,-100 150,100
3D body: height 338.58, standoff 0, extent 87.51,37.51 112.51,62.51
3D body: height 31.5, standoff 0, extent 87.51,-62.49 112.51,-37.49
3D body: height 31.5, standoff 0, extent -12.49,37.51 12.51,62.51
3D body: height 338.58, standoff 0, extent -12.49,-62.49 12.51,-37.49
3D body: height 11.81, standoff 0, extent -50,-100 50,-75
3D body: height 11.81, standoff 0, extent -50,75 50,100
3D body: height 98.43, standoff 11.81, extent -50,-100 50,100
3D body: height 338.58, standoff 0, extent -12.49,37.51 12.51,62.51
3D body: height 31.5, standoff 0, extent -12.49,-62.49 12.51,-37.49
3D body: height 31.5, standoff 0, extent -112.49,37.51 -87.49,62.51
3D body: height 338.58, standoff 0, extent -112.49,-62.49 -87.49,-37.49
3D body: height 11.81, standoff 0, extent -150,-100 -50,-75
3D body: height 11.81, standoff 0, extent -150,75 -50,100
3D body: height 98.43, standoff 11.81, extent -150,-100 -50,100
3D body: height 338.58, standoff 0, extent -112.49,37.51 -87.49,62.51
3D body: height 31.5, standoff 0, extent -112.49,-62.49 -87.49,-37.49
3D body: height 31.5, standoff 0, extent -212.49,37.51 -187.49,62.51
3D body: height 338.58, standoff 0, extent -212.49,-62.49 -187.49,-37.49
3D body: height 11.81, standoff 0, extent -250,-100 -150,-75
3D body: height 11.81, standoff 0, extent -250,75 -150,100
3D body: height 98.43, standoff 11.81, extent -250,-100 -150,100
3D body: height 338.58, standoff 0, extent -212.49,37.51 -187.49,62.51
3D body: height 31.5, standoff 0, extent -212.49,-62.49 -187.49,-37.49
3D body: height 31.5, standoff 0, extent -312.49,37.51 -287.49,62.51
3D body: height 338.58, standoff 0, extent -312.49,-62.49 -287.49,-37.49
3D body: height 11.81, standoff 0, extent -350,-100 -250,-75
3D body: height 11.81, standoff 0, extent -350,75 -250,100
3D body: height 98.43, standoff 11.81, extent -350,-100 -250,100
3D body: height 338.58, standoff 0, extent -312.49,37.51 -287.49,62.51
3D body: height 31.5, standoff 0, extent -312.49,-62.49 -287.49,-37.49